# Altium schematic symbol library altera.SCHLIB: 68 symbols (part 1 of 6) (continued)
## EPF10K30-FBGA256 (continued)
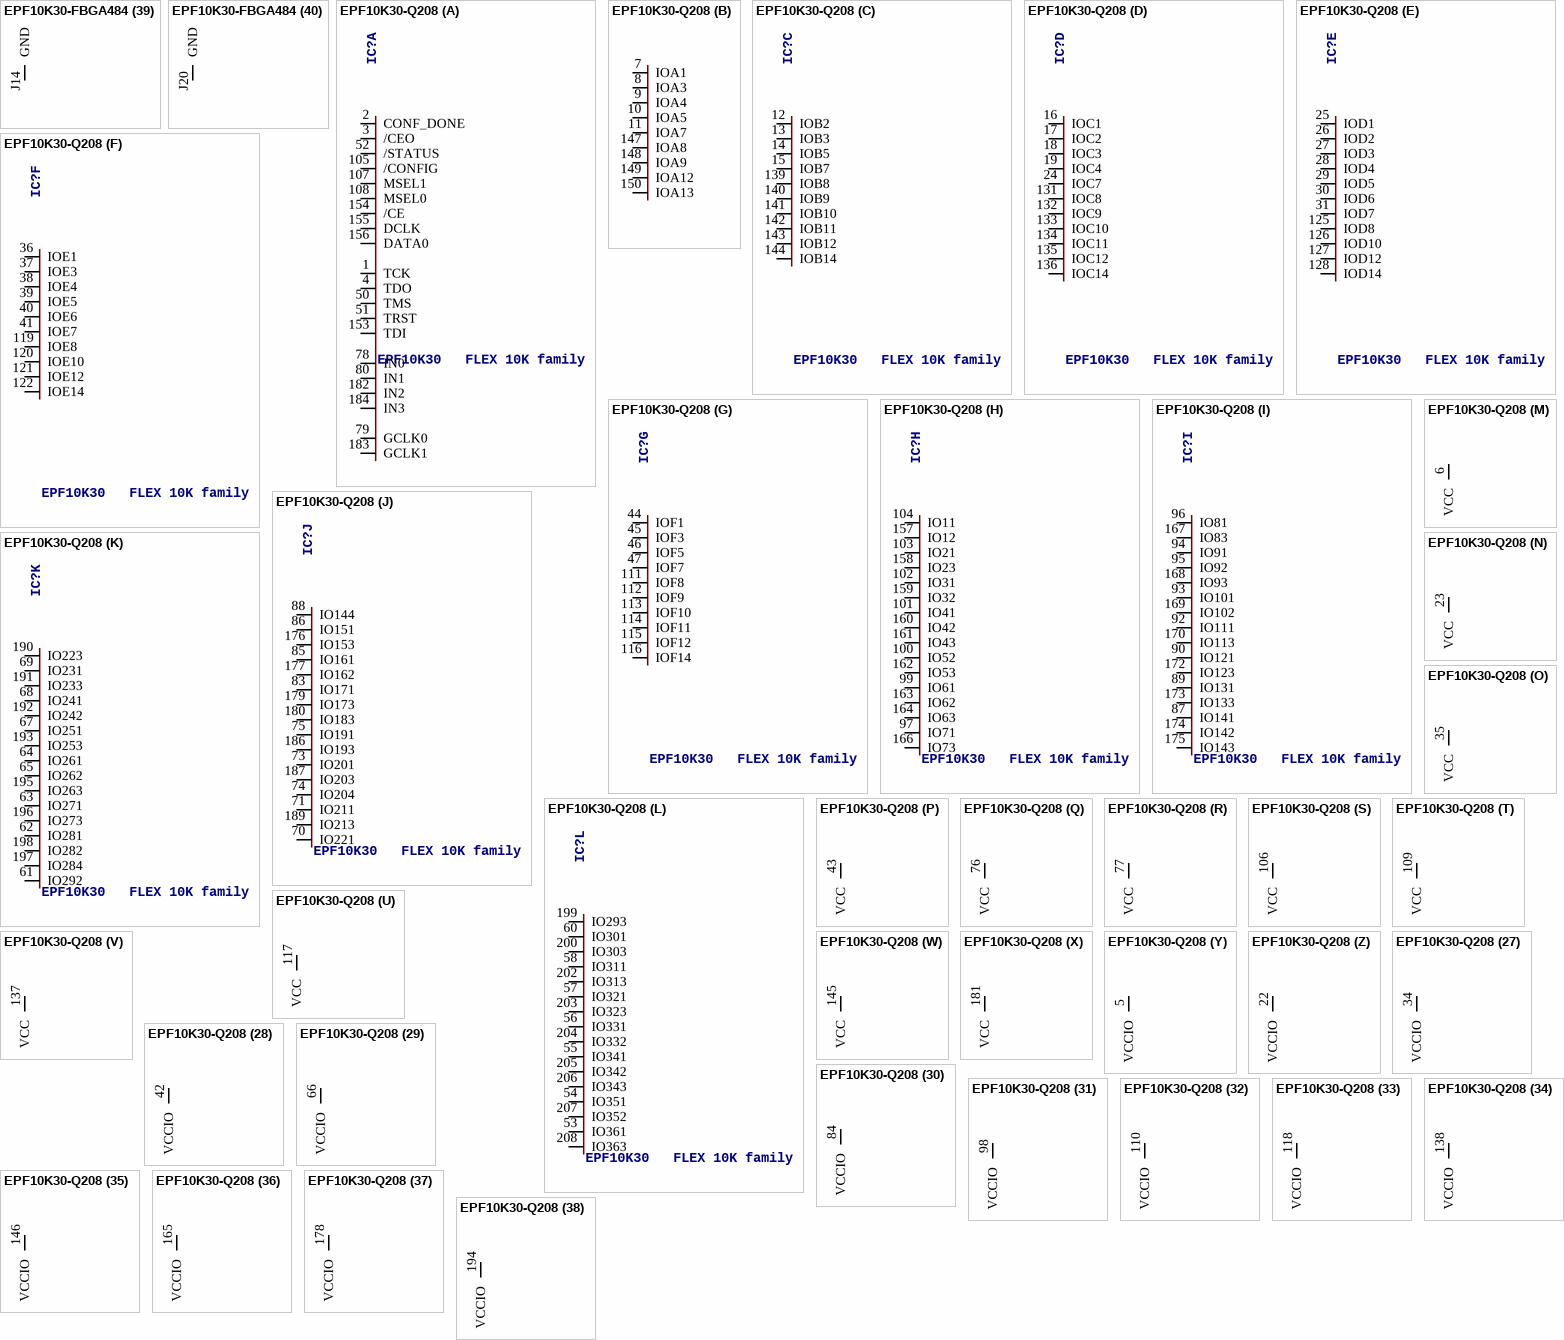
[diagram p8: symbols EPF10K30-FBGA484 to EPF10K30-Q208]

## EPF10K30-FBGA484
designator IC?, comment EPF10K30A   FLEX 10K family
MPN: EPF10K30AFC484-1; OC_FARNELL: unknown; OC_NEWARK: 51R8942
footprint FBGA484
part A pins: D4 DATA0, D12 GCLK1, E4 /CE, E5 DCLK, E12 IN3, E18 TCK, E19 /CEO, F5 TDI, F18 CONF_DONE, F19 TDO, H11 IN2, P11 GCLK0, R12 IN0, T7 /CONFIG, U4 MSEL0, U18 TMS, V4 MSEL1, V11 IN1, V19 TRST, W19 /STATUS
part B pins: D22 IOA2, F4 IOA13, F22 IOA14, G4 IOA15, G5 IOA12, G6 IOA11, G18 IOA5, G19 IOA4, H4 IOA8, H6 IOA10, H16 IOA1, H17 IOA3, H18 IOA7, J6 IOA16, J7 IOA9, J16 IOA6
part C pins: H1 IOB13, H5 IOB14, H19 IOB1, H21 IOB4, H22 IOB15, J4 IOB11, J5 IOB10, J17 IOB2, J18 IOB7, J19 IOB6, K6 IOB16, K7 IOB9, K8 IOB12, K15 IOB3, K16 IOB5, L8 IOB8
part D pins: K1 IOC13, K4 IOC14, K5 IOC12, K17 IOC1, K18 IOC3, K19 IOC4, K21 IOC5, L4 IOC15, L5 IOC9, L6 IOC10, L7 IOC11, L15 IOC2, L16 IOC6, L17 IOC7, L19 IOC16, M8 IOC8
part E pins: L18 IOD1, M1 IOD13, M4 IOD11, M5 IOD10, M6 IOD12, M7 IOD14, M15 IOD2, M16 IOD3, M17 IOD4, M18 IOD6, M19 IOD5, N4 IOD8, N6 IOD15, N7 IOD9, N15 IOD7, N19 IOD16
part F pins: N5 IOE14, N8 IOE12, N16 IOE3, N17 IOE2, N18 IOE1, P1 IOE13, P4 IOE10, P5 IOE9, P6 IOE11, P7 IOE15, P16 IOE7, P17 IOE4, P18 IOE5, P19 IOE6, R5 IOE8, R17 IOE16
part G pins: R4 IOF14, R6 IOF13, R7 IOF12, R16 IOF3, R18 IOF1, R19 IOF2, T4 IOF9, T5 IOF11, T6 IOF10, T16 IOF4, T17 IOF5, T18 IOF6, T19 IOF7, U5 IOF8, V1 IOF15, V21 IOF16
part H pins: AA5 IO44, C3 IO13, C4 IO24, C5 IO33, D5 IO23, D6 IO42, E6 IO12, E7 IO43, F6 IO32, U6 IO31, V6 IO41, W3 IO14, W4 IO11, W5 IO22, W6 IO21, Y5 IO34
part I pins: AB6 IO84, B6 IO54, B7 IO82, C7 IO74, D7 IO53, D8 IO83, E8 IO73, F7 IO62, G7 IO63, T8 IO71, U7 IO52, U8 IO81, V7 IO72, W7 IO61, Y6 IO51, Y7 IO64
part J pins: AA7 IO92, AA8 IO114, B8 IO103, C8 IO94, D9 IO124, E9 IO113, F8 IO93, F9 IO123, G8 IO102, H7 IO112, T9 IO101, U9 IO111, V8 IO104, V9 IO121, W8 IO91, W9 IO122
part K pins: A10 IO134, AA10 IO163, B11 IO164, D10 IO142, E10 IO143, F10 IO152, G9 IO133, G10 IO153, H10 IO162, R10 IO132, R11 IO161, T10 IO131, U10 IO144, V10 IO151, W10 IO141, Y10 IO154
part L pins: AB10 IO174, B13 IO194, D11 IO172, E11 IO173, F11 IO182, F12 IO193, G11 IO183, G12 IO202, H12 IO203, T11 IO171, T12 IO201, U11 IO181, U12 IO204, V12 IO192, W12 IO191, Y11 IO184
part M pins: AA14 IO234, AB14 IO224, B14 IO214, B15 IO243, D13 IO213, D14 IO242, E13 IO222, F13 IO223, G13 IO232, H13 IO233, R13 IO241, T13 IO231, U13 IO212, V13 IO211, W13 IO221, Y14 IO244
part N pins: A16 IO254, A17 IO273, AA16 IO283, D15 IO272, E14 IO253, E15 IO284, F14 IO264, F15 IO282, G14 IO263, T14 IO261, U14 IO262, U15 IO281, V14 IO252, V15 IO271, W14 IO251, Y15 IO274
part O pins: A18 IO294, A19 IO302, AA17 IO304, AA18 IO312, B18 IO314, D16 IO303, E16 IO313, F16 IO293, G16 IO322, G17 IO323, U16 IO301, U17 IO291, V16 IO321, W15 IO292, W16 IO311, Y17 IO324
part P pins: AA19 IO344, AA20 IO353, C18 IO333, C19 IO354, C20 IO364, D17 IO342, D18 IO352, D19 IO363, E17 IO343, F17 IO332, U19 IO362, V17 IO331, V18 IO361, W17 IO341, W18 IO351, Y18 IO334
part Q pins: AA1 GND (power)
part R pins: AA6 GND (power)
part S pins: AA22 GND (power)
part T pins: AB11 GND (power)
part U pins: AB16 GND (power)
part V pins: A1 GND (power)
part W pins: A8 GND (power)
part X pins: A22 GND (power)
part Y pins: B1 GND (power)
part Z pins: B2 GND (power)
part 27 pins: B17 GND (power)
part 28 pins: B21 GND (power)
part 29 pins: B22 GND (power)
part 30 pins: C2 GND (power)
part 31 pins: C21 GND (power)
part 32 pins: E21 GND (power)
part 33 pins: G3 GND (power)
part 34 pins: G21 GND (power)
part 35 pins: H2 GND (power)
part 36 pins: H8 GND (power)
part 37 pins: H15 GND (power)
part 38 pins: J9 GND (power)
part 39 pins: J14 GND (power)
part 40 pins: J20 GND (power)
part 41 pins: K3 GND (power)
part 42 pins: K10 GND (power)
part 43 pins: K12 GND (power)
part 44 pins: K13 GND (power)
part 45 pins: L11 GND (power)
part 46 pins: L12 GND (power)
part 47 pins: M11 GND (power)
part 48 pins: M12 GND (power)
part 49 pins: M20 GND (power)
part 50 pins: N10 GND (power)
part 51 pins: N13 GND (power)
part 52 pins: P9 GND (power)
part 53 pins: P14 GND (power)
part 54 pins: R8 GND (power)
part 55 pins: R15 GND (power)
part 56 pins: R22 GND (power)
part 57 pins: T1 GND (power)
part 58 pins: V3 GND (power)
part 59 pins: W11 GND (power)
part 60 pins: W20 GND (power)
part 61 pins: Y1 GND (power)
part 62 pins: Y2 GND (power)
part 63 pins: Y3 GND (power)
part 64 pins: Y21 GND (power)
part 65 pins: Y22 GND (power)
part 66 pins: AA2 NC
part 67 pins: AA3 NC
part 68 pins: AA4 NC
part 69 pins: AA9 NC
part 70 pins: AA11 NC
part 71 pins: AA13 NC
part 72 pins: AA15 NC
part 73 pins: AA21 NC
part 74 pins: AB1 NC
part 75 pins: AB2 NC
part 76 pins: AB3 NC
part 77 pins: AB4 NC
part 78 pins: AB5 NC
part 79 pins: AB7 NC
part 80 pins: AB8 NC
part 81 pins: AB9 NC
part 82 pins: AB12 NC
part 83 pins: AB15 NC
part 84 pins: AB17 NC
part 85 pins: AB18 NC
part 86 pins: AB19 NC
part 87 pins: AB20 NC
part 88 pins: AB21 NC
part 89 pins: AB22 NC
part 90 pins: A2 NC
part 91 pins: A3 NC
part 92 pins: A4 NC
part 93 pins: A5 NC
part 94 pins: A7 NC
part 95 pins: A9 NC
part 96 pins: A11 NC
part 97 pins: A12 NC
part 98 pins: A14 NC
part 99 pins: A15 NC
part 100 pins: A20 NC
part 101 pins: A21 NC
part 102 pins: B3 NC
part 103 pins: B4 NC
part 104 pins: B9 NC
part 105 pins: B10 NC
part 106 pins: B12 NC
part 107 pins: B16 NC
part 108 pins: B19 NC
part 109 pins: B20 NC
part 110 pins: C1 NC
part 111 pins: C6 NC
part 112 pins: C9 NC
part 113 pins: C10 NC
part 114 pins: C12 NC
part 115 pins: C13 NC
part 116 pins: C14 NC
part 117 pins: C16 NC
part 118 pins: C17 NC
part 119 pins: C22 NC
part 120 pins: D1 NC
part 121 pins: D2 NC
part 122 pins: D3 NC
part 123 pins: D20 NC
part 124 pins: D21 NC
part 125 pins: E2 NC
part 126 pins: E3 NC
part 127 pins: E20 NC
part 128 pins: E22 NC
part 129 pins: F1 NC
part 130 pins: F2 NC
part 131 pins: F3 NC
part 132 pins: F20 NC
part 133 pins: F21 NC
part 134 pins: G2 NC
part 135 pins: G20 NC
part 136 pins: G22 NC
part 137 pins: H3 NC
part 138 pins: J1 NC
part 139 pins: J2 NC
part 140 pins: J3 NC
part 141 pins: J21 NC
part 142 pins: J22 NC
part 143 pins: K2 NC
part 144 pins: K22 NC
part 145 pins: L1 NC
part 146 pins: L2 NC
part 147 pins: L3 NC
part 148 pins: L20 NC
part 149 pins: L21 NC
part 150 pins: L22 NC
part 151 pins: M2 NC
part 152 pins: M3 NC
part 153 pins: M21 NC
part 154 pins: M22 NC
part 155 pins: N1 NC
part 156 pins: N2 NC
part 157 pins: N21 NC
part 158 pins: N22 NC
part 159 pins: P2 NC
part 160 pins: P3 NC
part 161 pins: P20 NC
part 162 pins: P21 NC
part 163 pins: P22 NC
part 164 pins: R2 NC
part 165 pins: R3 NC
part 166 pins: R20 NC
part 167 pins: R21 NC
part 168 pins: T2 NC
part 169 pins: T20 NC
part 170 pins: T21 NC
part 171 pins: U1 NC
part 172 pins: U2 NC
part 173 pins: U3 NC
part 174 pins: U20 NC
part 175 pins: U21 NC
part 176 pins: U22 NC
part 177 pins: V2 NC
part 178 pins: V20 NC
part 179 pins: W1 NC
part 180 pins: W2 NC
part 181 pins: W22 NC
part 182 pins: Y4 NC
part 183 pins: Y9 NC
part 184 pins: Y12 NC
part 185 pins: Y13 NC
part 186 pins: Y16 NC
part 187 pins: Y19 NC
part 188 pins: Y20 NC
part 189 pins: AA12 VCC (power)
part 190 pins: C11 VCC (power)
part 191 pins: C15 VCC (power)
part 192 pins: H14 VCC (power)
part 193 pins: J8 VCC (power)
part 194 pins: J10 VCC (power)
part 195 pins: J12 VCC (power)
part 196 pins: J15 VCC (power)
part 197 pins: L9 VCC (power)
part 198 pins: L10 VCC (power)
part 199 pins: L13 VCC (power)
part 200 pins: M10 VCC (power)
part 201 pins: M13 VCC (power)
part 202 pins: M14 VCC (power)
part 203 pins: N12 VCC (power)
part 204 pins: P8 VCC (power)
part 205 pins: P10 VCC (power)
part 206 pins: P12 VCC (power)
part 207 pins: P15 VCC (power)
part 208 pins: R14 VCC (power)
part 209 pins: V5 VCC (power)
part 210 pins: W21 VCC (power)
part 211 pins: Y8 VCC (power)
part 212 pins: AB13 VCCIO (power)
part 213 pins: A6 VCCIO (power)
part 214 pins: A13 VCCIO (power)
part 215 pins: B5 VCCIO (power)
part 216 pins: E1 VCCIO (power)
part 217 pins: G1 VCCIO (power)
part 218 pins: G15 VCCIO (power)
part 219 pins: H9 VCCIO (power)
part 220 pins: H20 VCCIO (power)
part 221 pins: J11 VCCIO (power)
part 222 pins: J13 VCCIO (power)
part 223 pins: K9 VCCIO (power)
part 224 pins: K11 VCCIO (power)
part 225 pins: K14 VCCIO (power)
part 226 pins: K20 VCCIO (power)
part 227 pins: L14 VCCIO (power)
part 228 pins: M9 VCCIO (power)
part 229 pins: N3 VCCIO (power)
part 230 pins: N9 VCCIO (power)
part 231 pins: N11 VCCIO (power)
part 232 pins: N14 VCCIO (power)
part 233 pins: N20 VCCIO (power)
part 234 pins: P13 VCCIO (power)
part 235 pins: R1 VCCIO (power)
part 236 pins: R9 VCCIO (power)
part 237 pins: T3 VCCIO (power)
part 238 pins: T15 VCCIO (power)
part 239 pins: T22 VCCIO (power)
part 240 pins: V22 VCCIO (power)

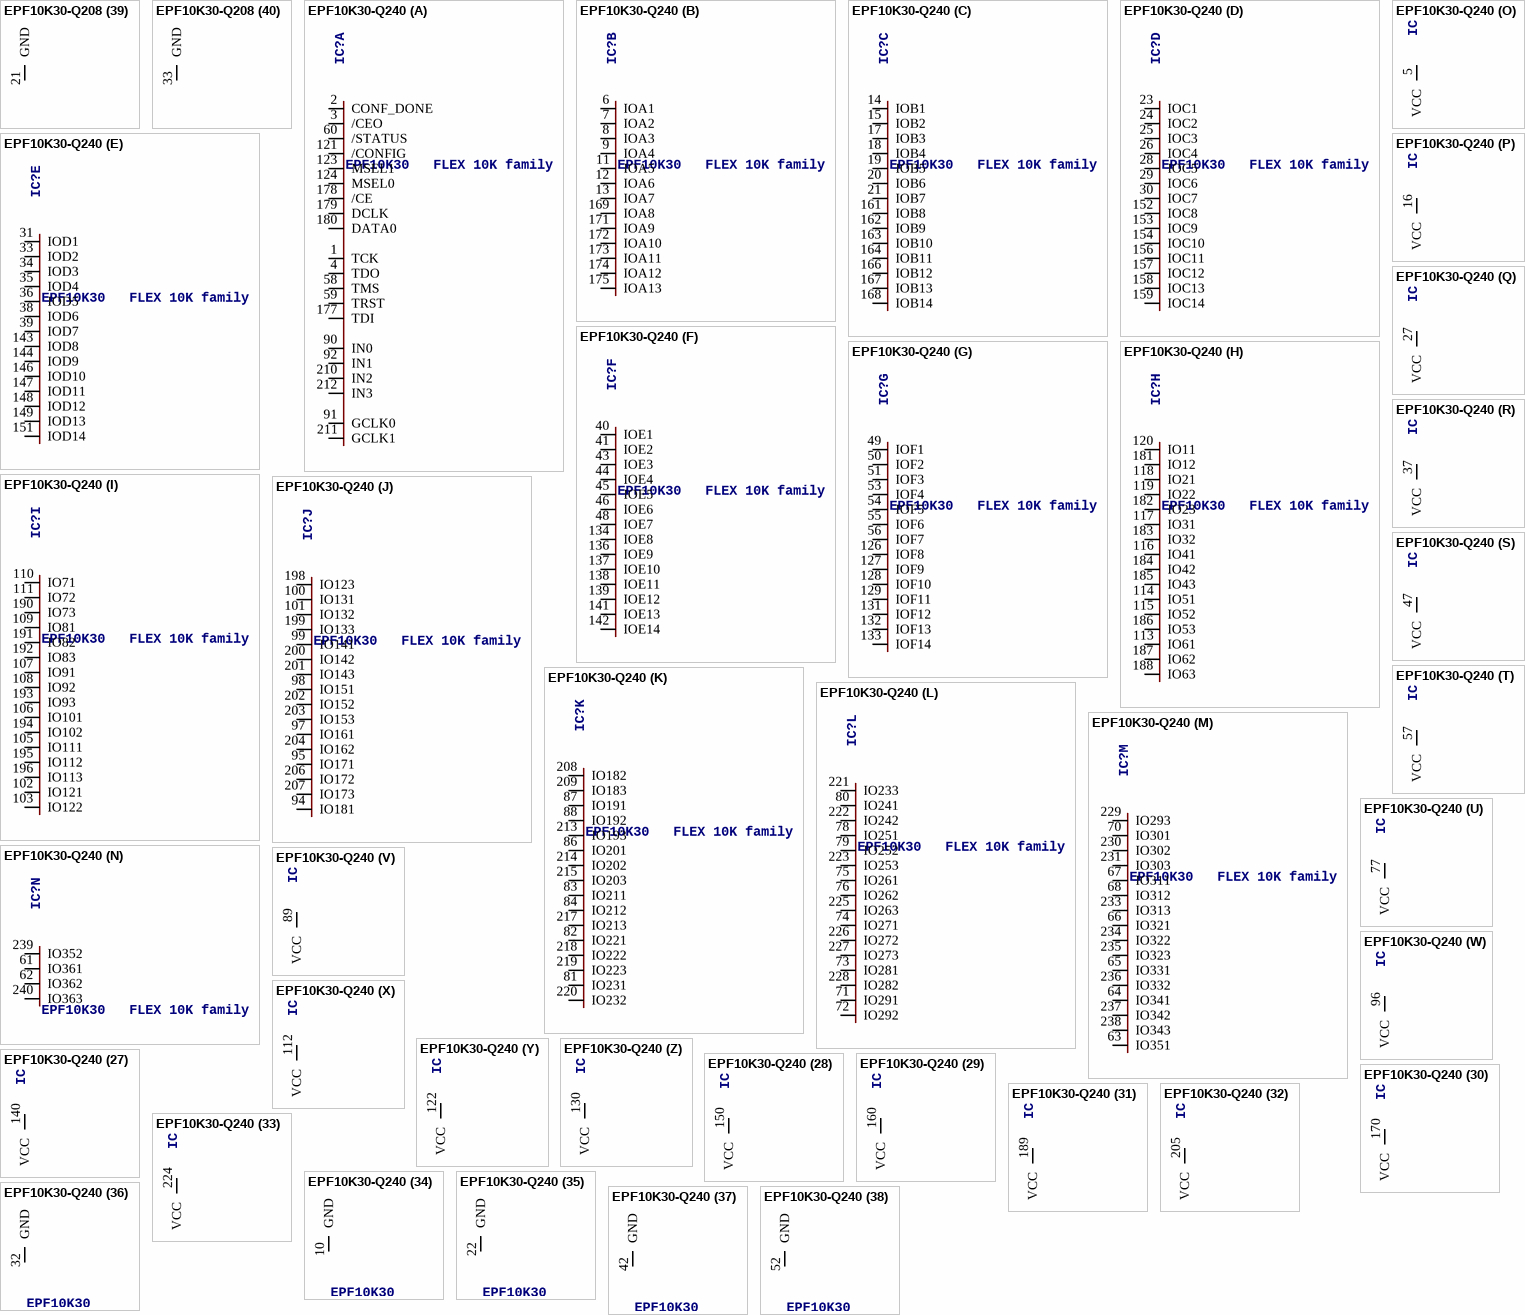
[diagram p9: symbols EPF10K30-Q208 to EPF10K30-Q240]

## EPF10K30-Q208
designator IC?, comment EPF10K30   FLEX 10K family
MPN: EPF10K30EQC208-2N; OC_FARNELL: 1549382; OC_NEWARK: 51R8987
footprint PQFP208
part A pins: 1 TCK, 2 CONF_DONE, 3 /CEO, 4 TDO, 50 TMS, 51 TRST, 52 /STATUS, 78 IN0, 79 GCLK0, 80 IN1, 105 /CONFIG, 107 MSEL1, 108 MSEL0, 153 TDI, 154 /CE, 155 DCLK, 156 DATA0, 182 IN2, 183 GCLK1, 184 IN3
part B pins: 7 IOA1, 8 IOA3, 9 IOA4, 10 IOA5, 11 IOA7, 147 IOA8, 148 IOA9, 149 IOA12, 150 IOA13
part C pins: 12 IOB2, 13 IOB3, 14 IOB5, 15 IOB7, 139 IOB8, 140 IOB9, 141 IOB10, 142 IOB11, 143 IOB12, 144 IOB14
part D pins: 16 IOC1, 17 IOC2, 18 IOC3, 19 IOC4, 24 IOC7, 131 IOC8, 132 IOC9, 133 IOC10, 134 IOC11, 135 IOC12, 136 IOC14
part E pins: 25 IOD1, 26 IOD2, 27 IOD3, 28 IOD4, 29 IOD5, 30 IOD6, 31 IOD7, 125 IOD8, 126 IOD10, 127 IOD12, 128 IOD14
part F pins: 36 IOE1, 37 IOE3, 38 IOE4, 39 IOE5, 40 IOE6, 41 IOE7, 119 IOE8, 120 IOE10, 121 IOE12, 122 IOE14
part G pins: 44 IOF1, 45 IOF3, 46 IOF5, 47 IOF7, 111 IOF8, 112 IOF9, 113 IOF10, 114 IOF11, 115 IOF12, 116 IOF14
part H pins: 97 IO71, 99 IO61, 100 IO52, 101 IO41, 102 IO31, 103 IO21, 104 IO11, 157 IO12, 158 IO23, 159 IO32, 160 IO42, 161 IO43, 162 IO53, 163 IO62, 164 IO63, 166 IO73
part I pins: 87 IO141, 89 IO131, 90 IO121, 92 IO111, 93 IO101, 94 IO91, 95 IO92, 96 IO81, 167 IO83, 168 IO93, 169 IO102, 170 IO113, 172 IO123, 173 IO133, 174 IO142, 175 IO143
part J pins: 70 IO221, 71 IO211, 73 IO201, 74 IO204, 75 IO191, 83 IO171, 85 IO161, 86 IO151, 88 IO144, 176 IO153, 177 IO162, 179 IO173, 180 IO183, 186 IO193, 187 IO203, 189 IO213
part K pins: 61 IO292, 62 IO281, 63 IO271, 64 IO261, 65 IO262, 67 IO251, 68 IO241, 69 IO231, 190 IO223, 191 IO233, 192 IO242, 193 IO253, 195 IO263, 196 IO273, 197 IO284, 198 IO282
part L pins: 53 IO361, 54 IO351, 55 IO341, 56 IO331, 57 IO321, 58 IO311, 60 IO301, 199 IO293, 200 IO303, 202 IO313, 203 IO323, 204 IO332, 205 IO342, 206 IO343, 207 IO352, 208 IO363
part M pins: 6 VCC (power)
part N pins: 23 VCC (power)
part O pins: 35 VCC (power)
part P pins: 43 VCC (power)
part Q pins: 76 VCC (power)
part R pins: 77 VCC (power)
part S pins: 106 VCC (power)
part T pins: 109 VCC (power)
part U pins: 117 VCC (power)
part V pins: 137 VCC (power)
part W pins: 145 VCC (power)
part X pins: 181 VCC (power)
part Y pins: 5 VCCIO (power)
part Z pins: 22 VCCIO (power)
part 27 pins: 34 VCCIO (power)
part 28 pins: 42 VCCIO (power)
part 29 pins: 66 VCCIO (power)
part 30 pins: 84 VCCIO (power)
part 31 pins: 98 VCCIO (power)
part 32 pins: 110 VCCIO (power)
part 33 pins: 118 VCCIO (power)
part 34 pins: 138 VCCIO (power)
part 35 pins: 146 VCCIO (power)
part 36 pins: 165 VCCIO (power)
part 37 pins: 178 VCCIO (power)
part 38 pins: 194 VCCIO (power)
part 39 pins: 21 GND (power)
part 40 pins: 33 GND (power)
part 41 pins: 49 GND (power)
part 42 pins: 81 GND (power)
part 43 pins: 82 GND (power)
part 44 pins: 123 GND (power)
part 45 pins: 129 GND (power)
part 46 pins: 151 GND (power)
part 47 pins: 185 GND (power)
part 48 pins: 20 GNDIO (power)
part 49 pins: 32 GNDIO (power)
part 50 pins: 48 GNDIO (power)
part 51 pins: 59 GNDIO (power)
part 52 pins: 72 GNDIO (power)
part 53 pins: 91 GNDIO (power)
part 54 pins: 124 GNDIO (power)
part 55 pins: 130 GNDIO (power)
part 56 pins: 152 GNDIO (power)
part 57 pins: 171 GNDIO (power)
part 58 pins: 188 GNDIO (power)
part 59 pins: 201 GNDIO (power)

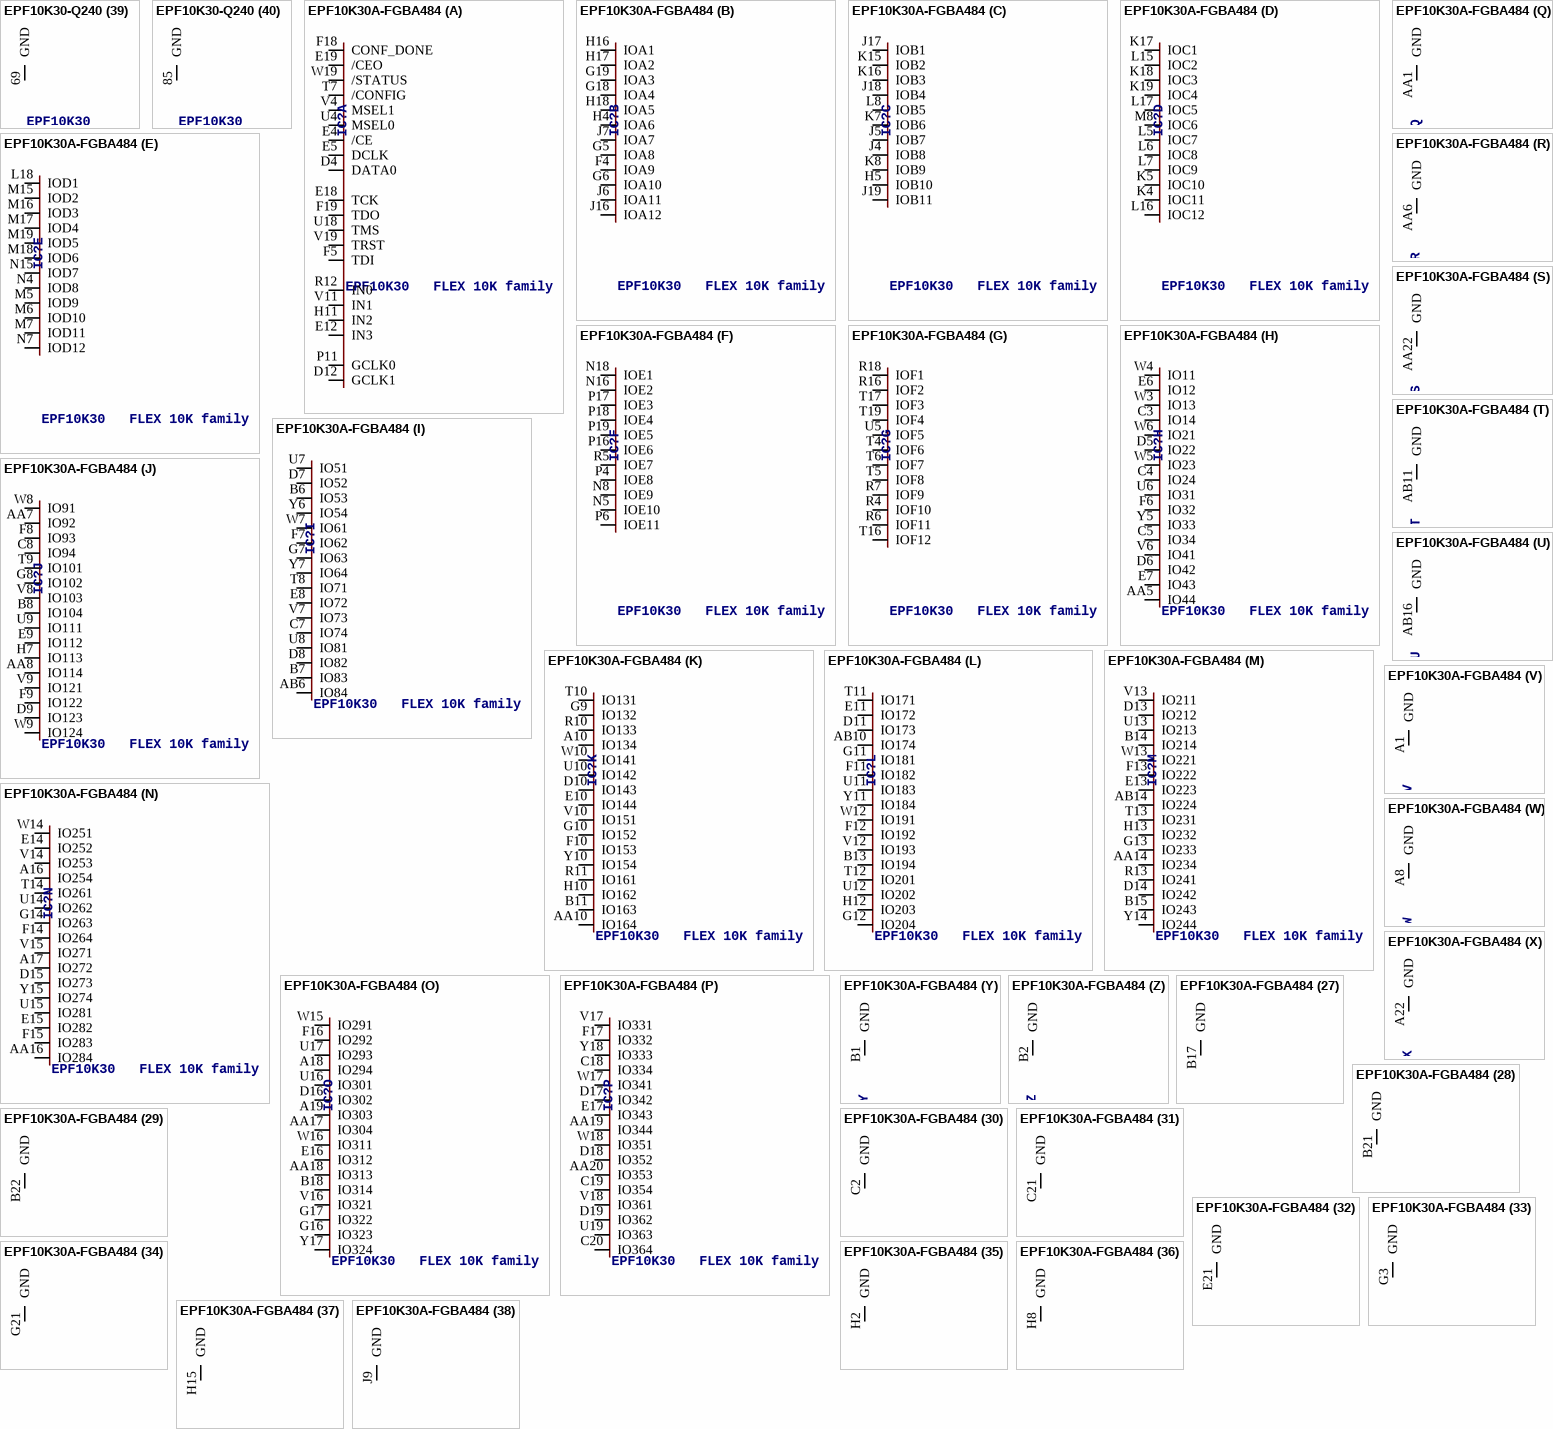
[diagram p10: symbols EPF10K30-Q240 to EPF10K30A-FGBA484]

## EPF10K30-Q240
designator IC?, comment EPF10K30   FLEX 10K family
MPN: EPF10K30AQC240-3N; OC_FARNELL: 1549384; OC_NEWARK: 51R8956
footprint PQFP240
part A pins: 1 TCK, 2 CONF_DONE, 3 /CEO, 4 TDO, 58 TMS, 59 TRST, 60 /STATUS, 90 IN0, 91 GCLK0, 92 IN1, 121 /CONFIG, 123 MSEL1, 124 MSEL0, 177 TDI, 178 /CE, 179 DCLK, 180 DATA0, 210 IN2, 211 GCLK1, 212 IN3
part B pins: 6 IOA1, 7 IOA2, 8 IOA3, 9 IOA4, 11 IOA5, 12 IOA6, 13 IOA7, 169 IOA8, 171 IOA9, 172 IOA10, 173 IOA11, 174 IOA12, 175 IOA13
part C pins: 14 IOB1, 15 IOB2, 17 IOB3, 18 IOB4, 19 IOB5, 20 IOB6, 21 IOB7, 161 IOB8, 162 IOB9, 163 IOB10, 164 IOB11, 166 IOB12, 167 IOB13, 168 IOB14
part D pins: 23 IOC1, 24 IOC2, 25 IOC3, 26 IOC4, 28 IOC5, 29 IOC6, 30 IOC7, 152 IOC8, 153 IOC9, 154 IOC10, 156 IOC11, 157 IOC12, 158 IOC13, 159 IOC14
part E pins: 31 IOD1, 33 IOD2, 34 IOD3, 35 IOD4, 36 IOD5, 38 IOD6, 39 IOD7, 143 IOD8, 144 IOD9, 146 IOD10, 147 IOD11, 148 IOD12, 149 IOD13, 151 IOD14
part F pins: 40 IOE1, 41 IOE2, 43 IOE3, 44 IOE4, 45 IOE5, 46 IOE6, 48 IOE7, 134 IOE8, 136 IOE9, 137 IOE10, 138 IOE11, 139 IOE12, 141 IOE13, 142 IOE14
part G pins: 49 IOF1, 50 IOF2, 51 IOF3, 53 IOF4, 54 IOF5, 55 IOF6, 56 IOF7, 126 IOF8, 127 IOF9, 128 IOF10, 129 IOF11, 131 IOF12, 132 IOF13, 133 IOF14
part H pins: 113 IO61, 114 IO51, 115 IO52, 116 IO41, 117 IO31, 118 IO21, 119 IO22, 120 IO11, 181 IO12, 182 IO23, 183 IO32, 184 IO42, 185 IO43, 186 IO53, 187 IO62, 188 IO63
part I pins: 102 IO121, 103 IO122, 105 IO111, 106 IO101, 107 IO91, 108 IO92, 109 IO81, 110 IO71, 111 IO72, 190 IO73, 191 IO82, 192 IO83, 193 IO93, 194 IO102, 195 IO112, 196 IO113
part J pins: 94 IO181, 95 IO171, 97 IO161, 98 IO151, 99 IO141, 100 IO131, 101 IO132, 198 IO123, 199 IO133, 200 IO142, 201 IO143, 202 IO152, 203 IO153, 204 IO162, 206 IO172, 207 IO173
part K pins: 81 IO231, 82 IO221, 83 IO211, 84 IO212, 86 IO201, 87 IO191, 88 IO192, 208 IO182, 209 IO183, 213 IO193, 214 IO202, 215 IO203, 217 IO213, 218 IO222, 219 IO223, 220 IO232
part L pins: 71 IO291, 72 IO292, 73 IO281, 74 IO271, 75 IO261, 76 IO262, 78 IO251, 79 IO252, 80 IO241, 221 IO233, 222 IO242, 223 IO253, 225 IO263, 226 IO272, 227 IO273, 228 IO282
part M pins: 63 IO351, 64 IO341, 65 IO331, 66 IO321, 67 IO311, 68 IO312, 70 IO301, 229 IO293, 230 IO302, 231 IO303, 233 IO313, 234 IO322, 235 IO323, 236 IO332, 237 IO342, 238 IO343
part N pins: 61 IO361, 62 IO362, 239 IO352, 240 IO363
part O pins: 5 VCC (power)
part P pins: 16 VCC (power)
part Q pins: 27 VCC (power)
part R pins: 37 VCC (power)
part S pins: 47 VCC (power)
part T pins: 57 VCC (power)
part U pins: 77 VCC (power)
part V pins: 89 VCC (power)
part W pins: 96 VCC (power)
part X pins: 112 VCC (power)
part Y pins: 122 VCC (power)
part Z pins: 130 VCC (power)
part 27 pins: 140 VCC (power)
part 28 pins: 150 VCC (power)
part 29 pins: 160 VCC (power)
part 30 pins: 170 VCC (power)
part 31 pins: 189 VCC (power)
part 32 pins: 205 VCC (power)
part 33 pins: 224 VCC (power)
part 34 pins: 10 GND (power)
part 35 pins: 22 GND (power)
part 36 pins: 32 GND (power)
part 37 pins: 42 GND (power)
part 38 pins: 52 GND (power)
part 39 pins: 69 GND (power)
part 40 pins: 85 GND (power)
part 41 pins: 93 GND (power)
part 42 pins: 104 GND (power)
part 43 pins: 125 GND (power)
part 44 pins: 135 GND (power)
part 45 pins: 145 GND (power)
part 46 pins: 155 GND (power)
part 47 pins: 165 GND (power)
part 48 pins: 176 GND (power)
part 49 pins: 197 GND (power)
part 50 pins: 216 GND (power)
part 51 pins: 232 GND (power)

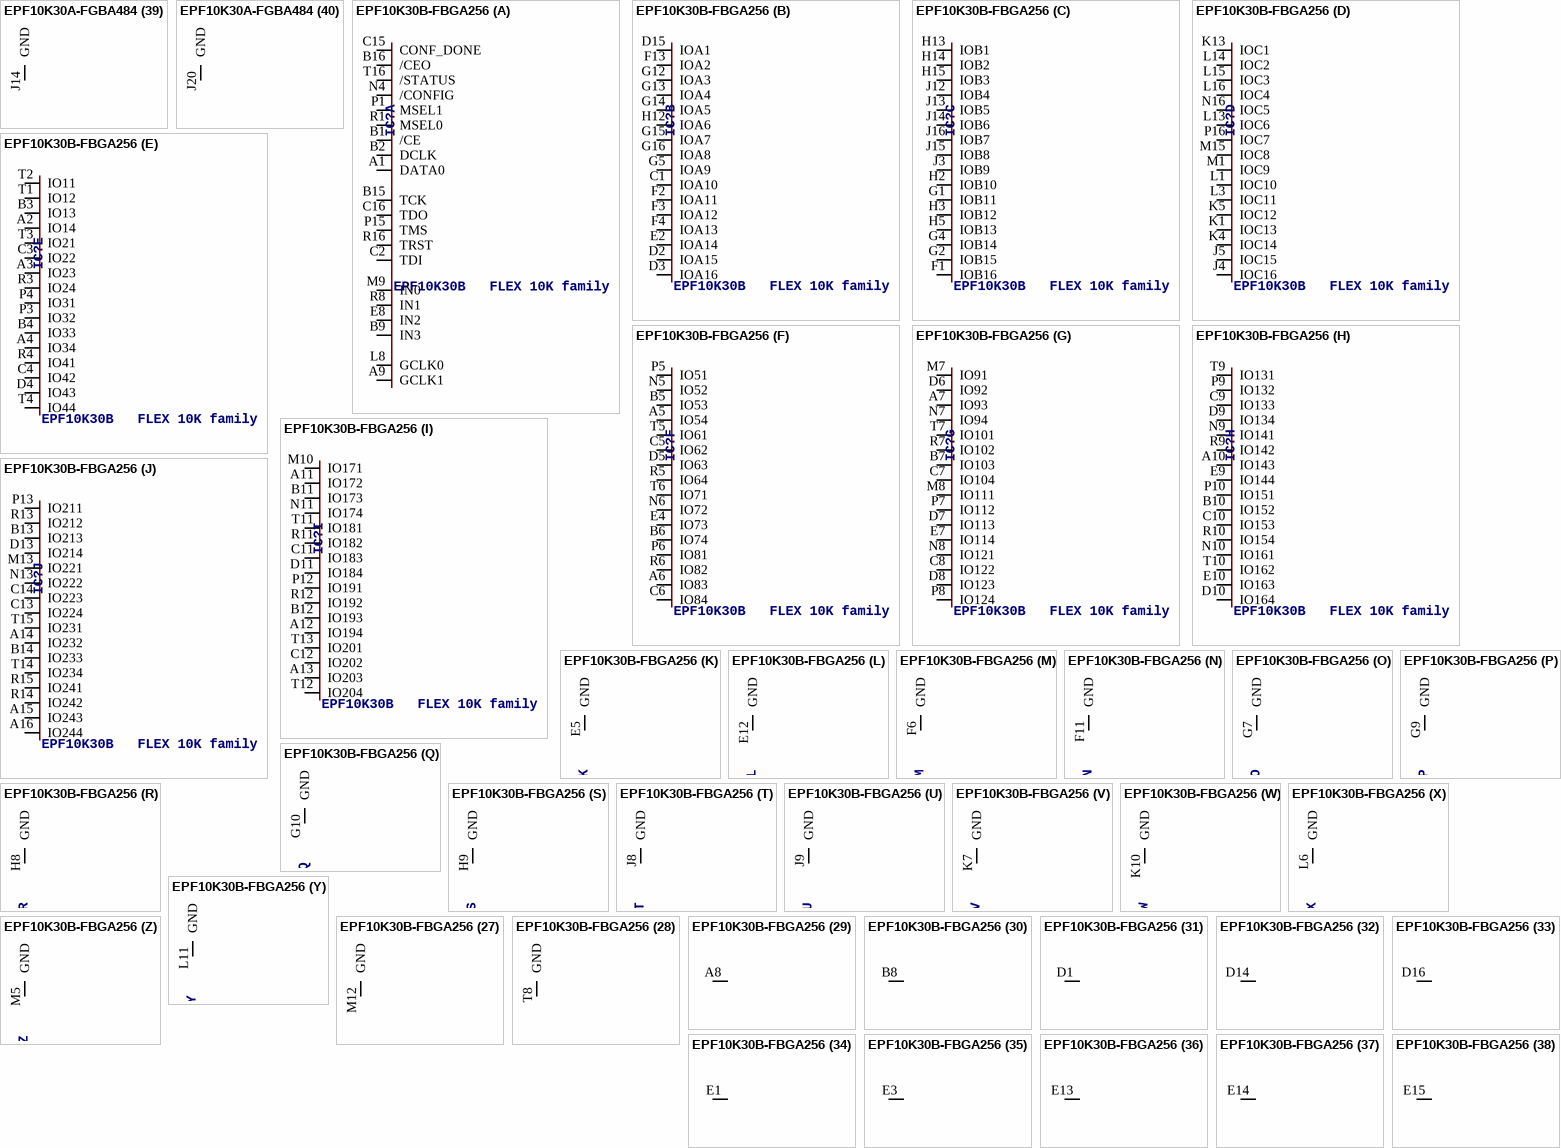
[diagram p11: symbols EPF10K30A-FGBA484 to EPF10K30B-FBGA256]